# Altium footprint library PcbLib1.PcbLib: 69 footprints (part 4 of 5)
Each footprint in its own frame and in the unit in brackets; x right, y up, seen from the top. Pads: shape width x height; smd on the part's side, far side on the other; paste and mask are expansions set on the pad; w line width, h text height; cw(c..) or ccw(c..) is an arc to the next point about the centre after c.
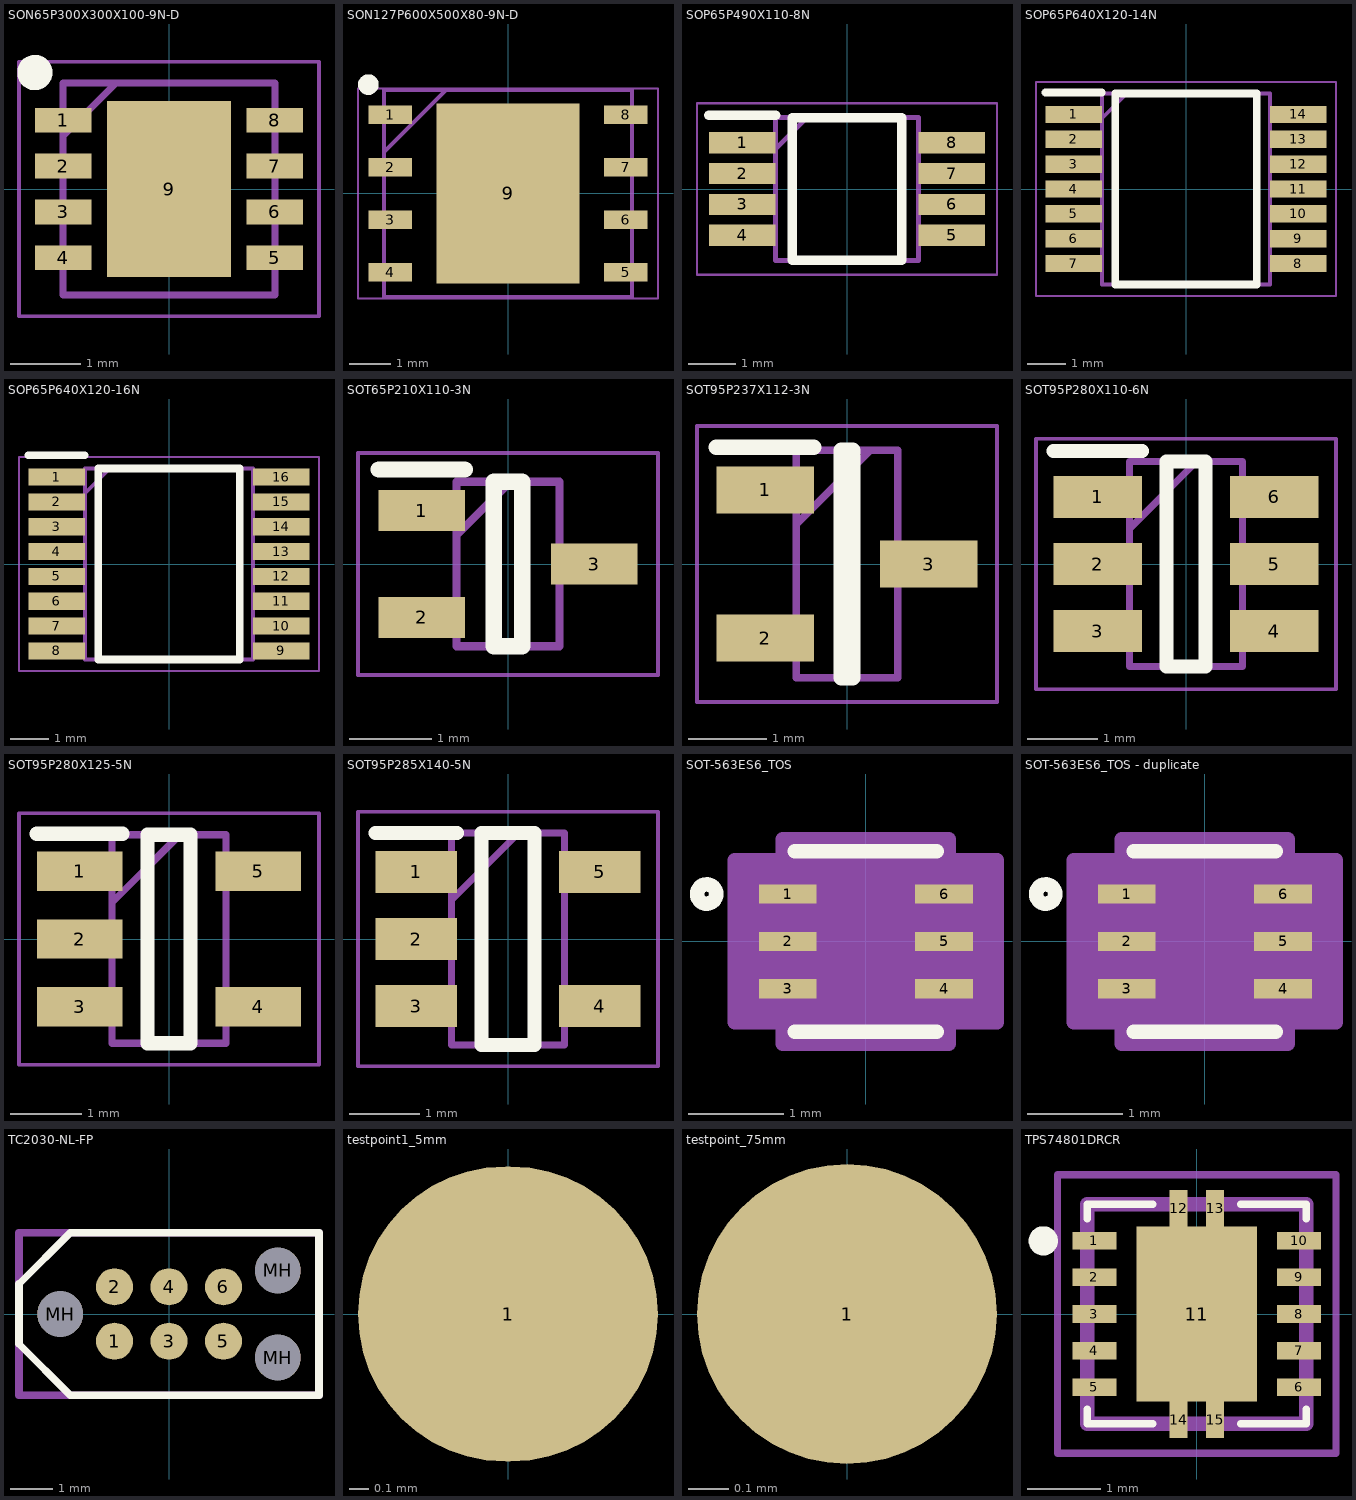
[diagram p3: the footprints below, top view; thin cyan lines are the x and y axes]

## SON65P300X300X100-9N-D [mm]
pads (9):
  rect 0.8x0.35 smd: 1(-1.5,0.975) 2(-1.5,0.325) 3(-1.5,-0.325) 4(-1.5,-0.975) 5(1.5,-0.975) 6(1.5,-0.325) 7(1.5,0.325) 8(1.5,0.975)
  rect 1.75x2.5 smd: 9(0,0)
Top Overlay:
  circle w0.25: c-1.9,1.65 r0.125
Mechanical 13:
  lines w0.1: -1.5,0.75 -0.75,1.5 ; -1.5,-1.5 1.5,-1.5 1.5,1.5 -1.5,1.5 -1.5,-1.5
Mechanical 15:
  lines w0.05: -2.125,-1.8 2.125,-1.8 2.125,1.8 -2.125,1.8 -2.125,-1.8
3D body "TPS78518QWDRBRQ1.stp": height 1, standoff 0, extent -1.5,-1.5 1.5,1.5

## SON127P600X500X80-9N-D [mm]
pads (9):
  rect 1.05x0.45 smd: 1(-2.85,1.905) 2(-2.85,0.635) 3(-2.85,-0.635) 4(-2.85,-1.905) 5(2.85,-1.905) 6(2.85,-0.635) 7(2.85,0.635) 8(2.85,1.905)
  rect 3.45x4.35 smd: 9(0,0)
Top Overlay:
  circle w0.25: c-3.375,2.63 r0.125
Mechanical 13:
  lines w0.1: -3,1 -1.5,2.5 ; -3,-2.5 3,-2.5 3,2.5 -3,2.5 -3,-2.5
Mechanical 15:
  lines w0.05: -3.625,-2.54 3.625,-2.54 3.625,2.54 -3.625,2.54 -3.625,-2.54
3D body "W25Q128JVPIQ_TR.stp": height 0.8, standoff 0, extent -3.05,-2.5 3.05,2.5

## SOP65P490X110-8N [mm]
pads (8):
  rect 1.4x0.45 smd: 1(-2.2,0.975) 2(-2.2,0.325) 3(-2.2,-0.325) 4(-2.2,-0.975) 5(2.2,-0.975) 6(2.2,-0.325) 7(2.2,0.325) 8(2.2,0.975)
Top Overlay:
  lines w0.2: -2.9,1.55 -1.5,1.55 ; -1.15,-1.5 -1.15,1.5 1.15,1.5 1.15,-1.5 -1.15,-1.5
Mechanical 13:
  lines w0.1: -1.5,0.85 -0.85,1.5 ; -1.5,-1.5 -1.5,1.5 1.5,1.5 1.5,-1.5 -1.5,-1.5
Mechanical 15:
  lines w0.05: -3.15,-1.8 -3.15,1.8 3.15,1.8 3.15,-1.8 -3.15,-1.8
3D body "REF6230IDGKR.stp": height 1.1, standoff 0, extent -2.451,-1.499 2.451,1.499

## SOP65P640X120-14N [mm]
pads (14):
  rect 1.475x0.45 smd: 1(-2.938,1.95) 2(-2.938,1.3) 3(-2.938,0.65) 4(-2.938,0) 5(-2.938,-0.65) 6(-2.938,-1.3) 7(-2.938,-1.95) 8(2.938,-1.95) 9(2.938,-1.3) 10(2.938,-0.65) 11(2.938,0) 12(2.938,0.65) 13(2.938,1.3) 14(2.938,1.95)
Top Overlay:
  lines w0.2: -3.675,2.525 -2.2,2.525 ; -1.85,-2.5 -1.85,2.5 1.85,2.5 1.85,-2.5 -1.85,-2.5
Mechanical 13:
  lines w0.1: -2.2,1.85 -1.55,2.5 ; -2.2,-2.5 -2.2,2.5 2.2,2.5 2.2,-2.5 -2.2,-2.5
Mechanical 15:
  lines w0.05: -3.925,-2.8 -3.925,2.8 3.925,2.8 3.925,-2.8 -3.925,-2.8
3D body "SN74HCS21PWR.stp": height 1.13, standoff 0, extent -3.2,-2.5 3.2,2.5

## SOP65P640X120-16N [mm]
pads (16):
  rect 1.475x0.45 smd: 1(-2.938,2.275) 2(-2.938,1.625) 3(-2.938,0.975) 4(-2.938,0.325) 5(-2.938,-0.325) 6(-2.938,-0.975) 7(-2.938,-1.625) 8(-2.938,-2.275) 9(2.938,-2.275) 10(2.938,-1.625) 11(2.938,-0.975) 12(2.938,-0.325) 13(2.938,0.325) 14(2.938,0.975) 15(2.938,1.625) 16(2.938,2.275)
Top Overlay:
  lines w0.2: -3.675,2.85 -2.2,2.85 ; -1.85,-2.5 -1.85,2.5 1.85,2.5 1.85,-2.5 -1.85,-2.5
Mechanical 13:
  lines w0.1: -2.2,1.85 -1.55,2.5 ; -2.2,-2.5 -2.2,2.5 2.2,2.5 2.2,-2.5 -2.2,-2.5
Mechanical 15:
  lines w0.05: -3.925,-2.8 -3.925,2.8 3.925,2.8 3.925,-2.8 -3.925,-2.8
3D body "CD4044BPWR.stp": height 1.13, standoff 0, extent -3.2,-2.5 3.2,2.5

## SOT65P210X110-3N [mm]
pads (3):
  rect 1.05x0.5 smd: 1(-1.05,0.65) 2(-1.05,-0.65) 3(1.05,0)
Top Overlay:
  lines w0.2: -1.575,1.15 -0.525,1.15 ; -0.175,-1 -0.175,1 0.175,1 0.175,-1 -0.175,-1
Mechanical 13:
  lines w0.1: -0.625,0.35 0.025,1 ; -0.625,-1 -0.625,1 0.625,1 0.625,-1 -0.625,-1
Mechanical 15:
  lines w0.05: -1.825,-1.35 -1.825,1.35 1.825,1.35 1.825,-1.35 -1.825,-1.35
3D body "ESDCAN03-2BWY.stp": height 1.1, standoff 0, extent -1.05,-1 1.05,1

## SOT95P237X112-3N [mm]
pads (3):
  rect 1.25x0.6 smd: 1(-1.05,0.95) 2(-1.05,-0.95) 3(1.05,0)
Top Overlay:
  lines w0.2: -1.675,1.5 -0.425,1.5 ; -0.075,-1.46 -0.075,1.46 0.075,1.46 0.075,-1.46 -0.075,-1.46
Mechanical 13:
  lines w0.1: -0.65,0.51 0.3,1.46 ; -0.65,-1.46 -0.65,1.46 0.65,1.46 0.65,-1.46 -0.65,-1.46
Mechanical 15:
  lines w0.05: -1.925,-1.77 -1.925,1.77 1.925,1.77 1.925,-1.77 -1.925,-1.77
3D body "ESD2CAN24DBZRQ1.stp": height 1.12, standoff 0, extent -1.185,-1.46 1.185,1.46

## SOT95P280X110-6N [mm]
pads (6):
  rect 1.25x0.6 smd: 1(-1.25,0.95) 2(-1.25,0) 3(-1.25,-0.95) 4(1.25,-0.95) 5(1.25,0) 6(1.25,0.95)
Top Overlay:
  lines w0.2: -1.875,1.6 -0.625,1.6 ; -0.275,-1.45 -0.275,1.45 0.275,1.45 0.275,-1.45 -0.275,-1.45
Mechanical 13:
  lines w0.1: -0.8,0.5 0.15,1.45 ; -0.8,-1.45 -0.8,1.45 0.8,1.45 0.8,-1.45 -0.8,-1.45
Mechanical 15:
  lines w0.05: -2.125,-1.775 -2.125,1.775 2.125,1.775 2.125,-1.775 -2.125,-1.775
3D body "TPS54202DDCR.stp": height 1.1, standoff 0, extent -1.4,-1.45 1.4,1.45

## SOT95P280X125-5N [mm]
pads (5):
  rect 1.2x0.55 smd: 1(-1.25,0.95) 2(-1.25,0) 3(-1.25,-0.95) 4(1.25,-0.95) 5(1.25,0.95)
Top Overlay:
  lines w0.2: -1.85,1.475 -0.65,1.475 ; -0.3,-1.46 -0.3,1.46 0.3,1.46 0.3,-1.46 -0.3,-1.46
Mechanical 13:
  lines w0.1: -0.8,0.51 0.15,1.46 ; -0.8,-1.46 -0.8,1.46 0.8,1.46 0.8,-1.46 -0.8,-1.46
Mechanical 15:
  lines w0.05: -2.1,-1.76 -2.1,1.76 2.1,1.76 2.1,-1.76 -2.1,-1.76
3D body "LDH40MR.stp": height 1.25, standoff 0, extent -1.4,-1.46 1.4,1.46

## SOT95P285X140-5N [mm]
pads (5):
  rect 1.15x0.6 smd: 1(-1.3,0.95) 2(-1.3,0) 3(-1.3,-0.95) 4(1.3,-0.95) 5(1.3,0.95)
Top Overlay:
  lines w0.2: -1.875,1.5 -0.725,1.5 ; -0.375,-1.5 0.375,-1.5 0.375,1.5 -0.375,1.5 -0.375,-1.5
Mechanical 13:
  lines w0.1: -0.8,0.55 0.15,1.5 ; -0.8,-1.5 0.8,-1.5 0.8,1.5 -0.8,1.5 -0.8,-1.5
Mechanical 15:
  lines w0.05: -2.125,-1.8 2.125,-1.8 2.125,1.8 -2.125,1.8 -2.125,-1.8
3D body "AP2112K-3.3TRG1.stp": height 1.4, standoff 0, extent -1.425,-1.5 1.425,1.5

## SOT-563ES6_TOS [mil]
pads (6):
  rect 24x8 smd paste+0 mask+0: 1(-32.5,19.68) 2(-32.5,0) 3(-32.5,-19.68) 4(32.5,-19.68) 5(32.5,0) 6(32.5,19.68)
Top Overlay:
  circle w6: c-66.19,19.68 r4
  lines w6: -29.5,-37.5 29.5,-37.5 ; -29.5,37.5 29.5,37.5
Mechanical 13:
  circle w0: c-20.5,19.68 r3
  lines w0: -12,32.5 ccw(c0,32.5) 12,32.5
  lines w1: -24.5,-32.5 24.5,-32.5 24.5,32.5 -24.5,32.5 -24.5,-32.5
Mechanical 15:
  region: -34.5,-33.69 -54.5,-33.69 -54.5,33.69 -34.5,33.69 -34.5,42.5 34.5,42.5 34.5,33.69 54.5,33.69 54.5,-33.69 34.5,-33.69 34.5,-42.5 -34.5,-42.5
  lines w6: -54.5,-33.69 -54.5,33.69 -34.5,33.69 -34.5,42.5 34.5,42.5 34.5,33.69 54.5,33.69 54.5,-33.69 34.5,-33.69 34.5,-42.5 -34.5,-42.5 -34.5,-33.69 -54.5,-33.69
3D body "SOT-563ES6_TOS.step": height 24.09, standoff 0, extent -32.52,-32.52 32.52,32.52

## SOT-563ES6_TOS - duplicate [mil]
pads (6):
  rect 24x8 smd paste+0 mask+0: 1(-32.5,19.68) 2(-32.5,0) 3(-32.5,-19.68) 4(32.5,-19.68) 5(32.5,0) 6(32.5,19.68)
Top Overlay:
  circle w6: c-66.19,19.68 r4
  lines w6: -29.5,-37.5 29.5,-37.5 ; -29.5,37.5 29.5,37.5
Mechanical 13:
  circle w0: c-20.5,19.68 r3
  lines w0: -12,32.5 ccw(c0,32.5) 12,32.5
  lines w1: -24.5,-32.5 -24.5,32.5 24.5,32.5 24.5,-32.5 -24.5,-32.5
Mechanical 15:
  region: -34.5,-33.69 -54.5,-33.69 -54.5,33.69 -34.5,33.69 -34.5,42.5 34.5,42.5 34.5,33.69 54.5,33.69 54.5,-33.69 34.5,-33.69 34.5,-42.5 -34.5,-42.5
  lines w6: -54.5,-33.69 -34.5,-33.69 -34.5,-42.5 34.5,-42.5 34.5,-33.69 54.5,-33.69 54.5,33.69 34.5,33.69 34.5,42.5 -34.5,42.5 -34.5,33.69 -54.5,33.69 -54.5,-33.69
3D body "SOT-563ES6_TOS.step": height 24.09, standoff 0, extent -32.52,-32.52 32.52,32.52

## TC2030-NL-FP [mil]
pads (9):
  round 33.98 smd paste-16.99: 1(-50,-25) 2(-50,25) 3(0,-25) 4(0,25) 5(50,-25) 6(50,25)
  round 42.01 hole 42.01 unplated: MH(-100,0) MH(100,-40) MH(100,40)
Top Overlay:
  lines w6.89: -137.8,-27.56 -137.8,27.56 -90.55,74.8 137.8,74.8 137.8,-74.8 -90.55,-74.8 -137.8,-27.56
Mechanical 13:
  lines w6.89: -137.8,-74.8 -137.8,74.8 137.8,74.8 137.8,-74.8 -137.8,-74.8
  text "'.Designator'" at -339.89,-24.99 h60

## testpoint1_5mm [mm]
pads (1):
  oval 1.524x1.5 smd: 1(0,0)

## testpoint_75mm [mm]
pads (1):
  round 0.75 smd: 1(0,0)

## TPS74801DRCR [mm]
pads (15):
  rect 0.6x0.24 smd: 1(-1.4,1) 2(-1.4,0.5) 3(-1.4,0) 4(-1.4,-0.5) 5(-1.4,-1) 6(1.4,-1) 7(1.4,-0.5) 8(1.4,0) 9(1.4,0.5) 10(1.4,1)
  rect 1.65x2.4 smd: 11(0,0)
  rect 0.25x0.5 smd: 12(-0.25,1.45) 13(0.25,1.45) 14(-0.25,-1.45) 15(0.25,-1.45)
Top Overlay:
  lines w0.1: -1.5,-1.3 -1.5,-1.5 -0.6,-1.5 ; -1.5,1.3 -1.5,1.5 -0.6,1.5 ; 0.6,-1.5 1.5,-1.5 1.5,-1.3 ; 0.6,1.5 1.5,1.5 1.5,1.3
  lines w0.2: -2.1,0.9 ccw(c-2.1,1) -2.1,1.1 ccw(c-2.1,1) -2.1,0.9
Mechanical 13:
  lines w0.2: -1.5,-1.5 -1.5,1.5 1.5,1.5 1.5,-1.5 -1.5,-1.5
Mechanical 15:
  lines w0.1: -1.905,-1.905 -1.905,1.905 1.905,1.905 1.905,-1.905 -1.905,-1.905
3D body "TPS74801DRCR.stp": height 1, standoff 0, extent -1.5,-1.5 1.5,1.5